# Altium footprint library 1.02-电位器.PcbLib: 37 footprints (part 3 of 3)
Each footprint in its own frame and in the unit in brackets; x right, y up, seen from the top. Pads: shape width x height; smd on the part's side, far side on the other; paste and mask are expansions set on the pad; w line width, h text height; cw(c..) or ccw(c..) is an arc to the next point about the centre after c.
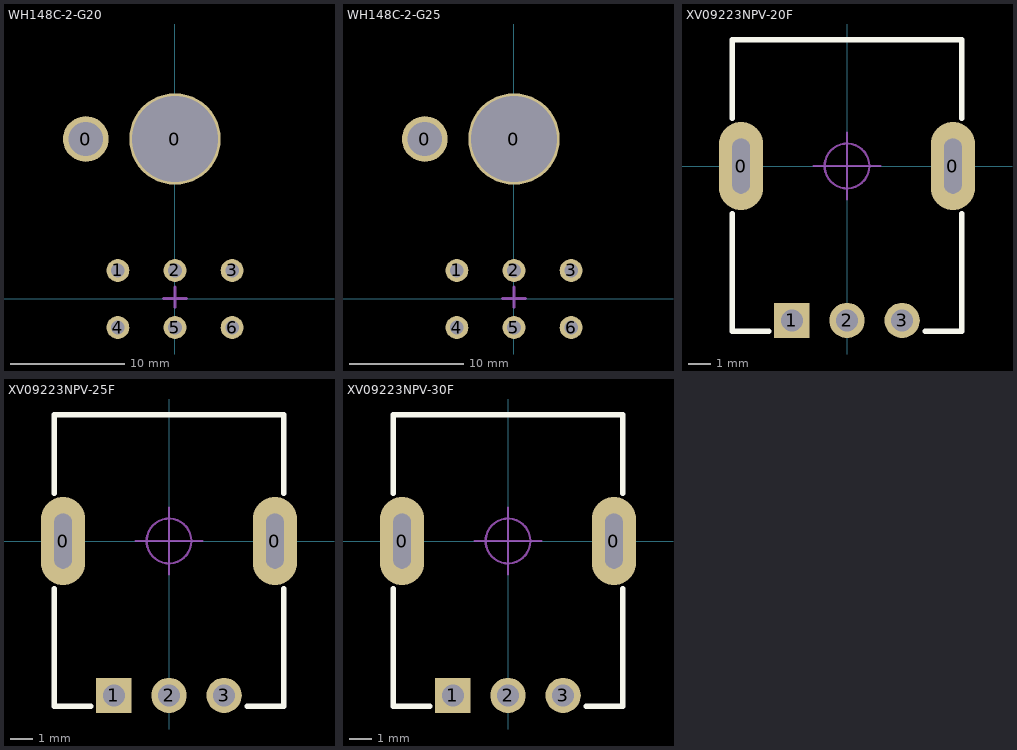
[diagram p2: the footprints below, top view; thin cyan lines are the x and y axes]

## WH148C-2-G20 [mm] "双联弯脚电位器，脚距：5mm，柄长：20mm  淘宝ID:黄晶宝石"
pads (8):
  round 4 hole 3: 0(-7.8,13.97)
  round 8 hole 7.5: 0(0,13.97)
  round 2 hole 1.2: 1(-5,2.47) 2(0,2.47) 3(5,2.47) 4(-5,-2.53) 5(0,-2.53) 6(5,-2.53)
Bottom Overlay:
  lines w0.254: -8,10.346 -8,-2.75 -6.25,-2.75 ; -7.97,10.359 cw(c0,13.97) 7.981,10.383 ; -5.08,-1.26 -5.08,-0.498 -2.54,-0.498 ; -5.08,1.28 -5.08,0.518 -2.54,0.518 ; -3.75,-2.75 -1.25,-2.75 ; -0.254,-1.006 0,-0.752 ; -0.254,1.026 0,0.772 ; 0,-1.26 0,-0.752 ; 0,1.28 0,0.772 ; 0.254,-1.006 0,-0.752 ; 0.254,1.026 0,0.772 ; 1.25,-2.75 3.75,-2.75 ; 2.54,-0.498 5.08,-0.498 5.08,-1.26 ; 2.54,0.518 5.08,0.518 5.08,1.28 ; 6.25,-2.75 8,-2.75 8,10.375 ; -2.54,-0.498 -2.54,-0.752 2.54,-0.752 2.54,-0.244 -2.54,-0.244 -2.54,-0.498 ; -2.54,0.518 -2.54,0.264 2.54,0.264 2.54,0.772 -2.54,0.772 -2.54,0.518
Mechanical 15:
  lines w0.254: -1.016,0.01 1.016,0.01 ; 0,-0.752 0,1.026
3D body: height 12.51, standoff -19.5, extent -8.45,-2.92 8.45,22.23

## WH148C-2-G25 [mm] "双联弯脚电位器，脚距：5mm，柄长：25mm"
pads (8):
  round 4 hole 3: 0(-7.8,13.97)
  round 8 hole 7.5: 0(0,13.97)
  round 2 hole 1.2: 1(-5,2.47) 2(0,2.47) 3(5,2.47) 4(-5,-2.53) 5(0,-2.53) 6(5,-2.53)
Bottom Overlay:
  lines w0.254: -8,10.346 -8,-2.75 -6.25,-2.75 ; -7.97,10.359 cw(c0,13.97) 7.981,10.383 ; -5.08,-1.26 -5.08,-0.498 -2.54,-0.498 ; -5.08,1.28 -5.08,0.518 -2.54,0.518 ; -3.75,-2.75 -1.25,-2.75 ; -0.254,-1.006 0,-0.752 ; -0.254,1.026 0,0.772 ; 0,-1.26 0,-0.752 ; 0,1.28 0,0.772 ; 0.254,-1.006 0,-0.752 ; 0.254,1.026 0,0.772 ; 1.25,-2.75 3.75,-2.75 ; 2.54,-0.498 5.08,-0.498 5.08,-1.26 ; 2.54,0.518 5.08,0.518 5.08,1.28 ; 6.25,-2.75 8,-2.75 8,10.375 ; -2.54,-0.498 -2.54,-0.244 2.54,-0.244 2.54,-0.752 -2.54,-0.752 -2.54,-0.498 ; -2.54,0.518 -2.54,0.772 2.54,0.772 2.54,0.264 -2.54,0.264 -2.54,0.518
Mechanical 15:
  lines w0.254: -1.016,0.01 1.016,0.01 ; 0,-0.752 0,1.026
3D body: height 12.51, standoff -24.5, extent -8.4,-2.775 8.5,22.375

## XV09223NPV-20F [mm] "长9.85mm，宽11.55mm，高20mm"
pads (5):
  oval 2x4 hole 0.8 slot 2.5 at 90 deg: 0(-4.8,0) 0(4.8,0)
  rect 1.6x1.6 hole 1: 1(-2.5,-7)
  round 1.6 hole 1: 2(0,-7) 3(2.5,-7)
Top Overlay:
  lines w0.254: -5.207,-2.159 -5.207,-7.493 -3.556,-7.493 ; -5.207,2.159 -5.207,5.715 5.207,5.715 5.207,2.159 ; 3.556,-7.493 5.207,-7.493 5.207,-2.159
Mechanical 15:
  circle w0.1: c0,0 r1.016
  lines w0.1: -1.524,0 1.524,0 ; 0,-1.524 0,1.524
3D body: height 20, standoff -3.8, extent -4.925,-7.15 4.925,5.5

## XV09223NPV-25F [mm] "长9.85mm，宽11.55mm，高25mm"
pads (5):
  oval 2x4 hole 0.8 slot 2.5 at 90 deg: 0(-4.8,0) 0(4.8,0)
  rect 1.6x1.6 hole 1: 1(-2.5,-7)
  round 1.6 hole 1: 2(0,-7) 3(2.5,-7)
Top Overlay:
  lines w0.254: -5.207,-2.159 -5.207,-7.493 -3.556,-7.493 ; -5.207,2.159 -5.207,5.715 5.207,5.715 5.207,2.159 ; 3.556,-7.493 5.207,-7.493 5.207,-2.159
Mechanical 15:
  circle w0.1: c0,0 r1.016
  lines w0.1: -1.524,0 1.524,0 ; 0,-1.524 0,1.524
3D body: height 25, standoff -3.8, extent -4.925,-7.15 4.925,5.5

## XV09223NPV-30F [mm] "长9.85mm，宽11.55mm，高30mm"
pads (5):
  oval 2x4 hole 0.8 slot 2.5 at 90 deg: 0(-4.8,0) 0(4.8,0)
  rect 1.6x1.6 hole 1: 1(-2.5,-7)
  round 1.6 hole 1: 2(0,-7) 3(2.5,-7)
Top Overlay:
  lines w0.254: -5.207,-2.159 -5.207,-7.493 -3.556,-7.493 ; -5.207,2.159 -5.207,5.715 5.207,5.715 5.207,2.159 ; 3.556,-7.493 5.207,-7.493 5.207,-2.159
Mechanical 15:
  circle w0.1: c0,0 r1.016
  lines w0.1: -1.524,0 1.524,0 ; 0,-1.524 0,1.524
3D body: height 30, standoff -3.8, extent -4.925,-7.15 4.925,5.5